# Altium footprint library agus_lib.PcbLib: 45 footprints (part 1 of 3)
Each footprint in its own frame and in the unit in brackets; x right, y up, seen from the top. Pads: shape width x height; smd on the part's side, far side on the other; paste and mask are expansions set on the pad; w line width, h text height; cw(c..) or ccw(c..) is an arc to the next point about the centre after c.
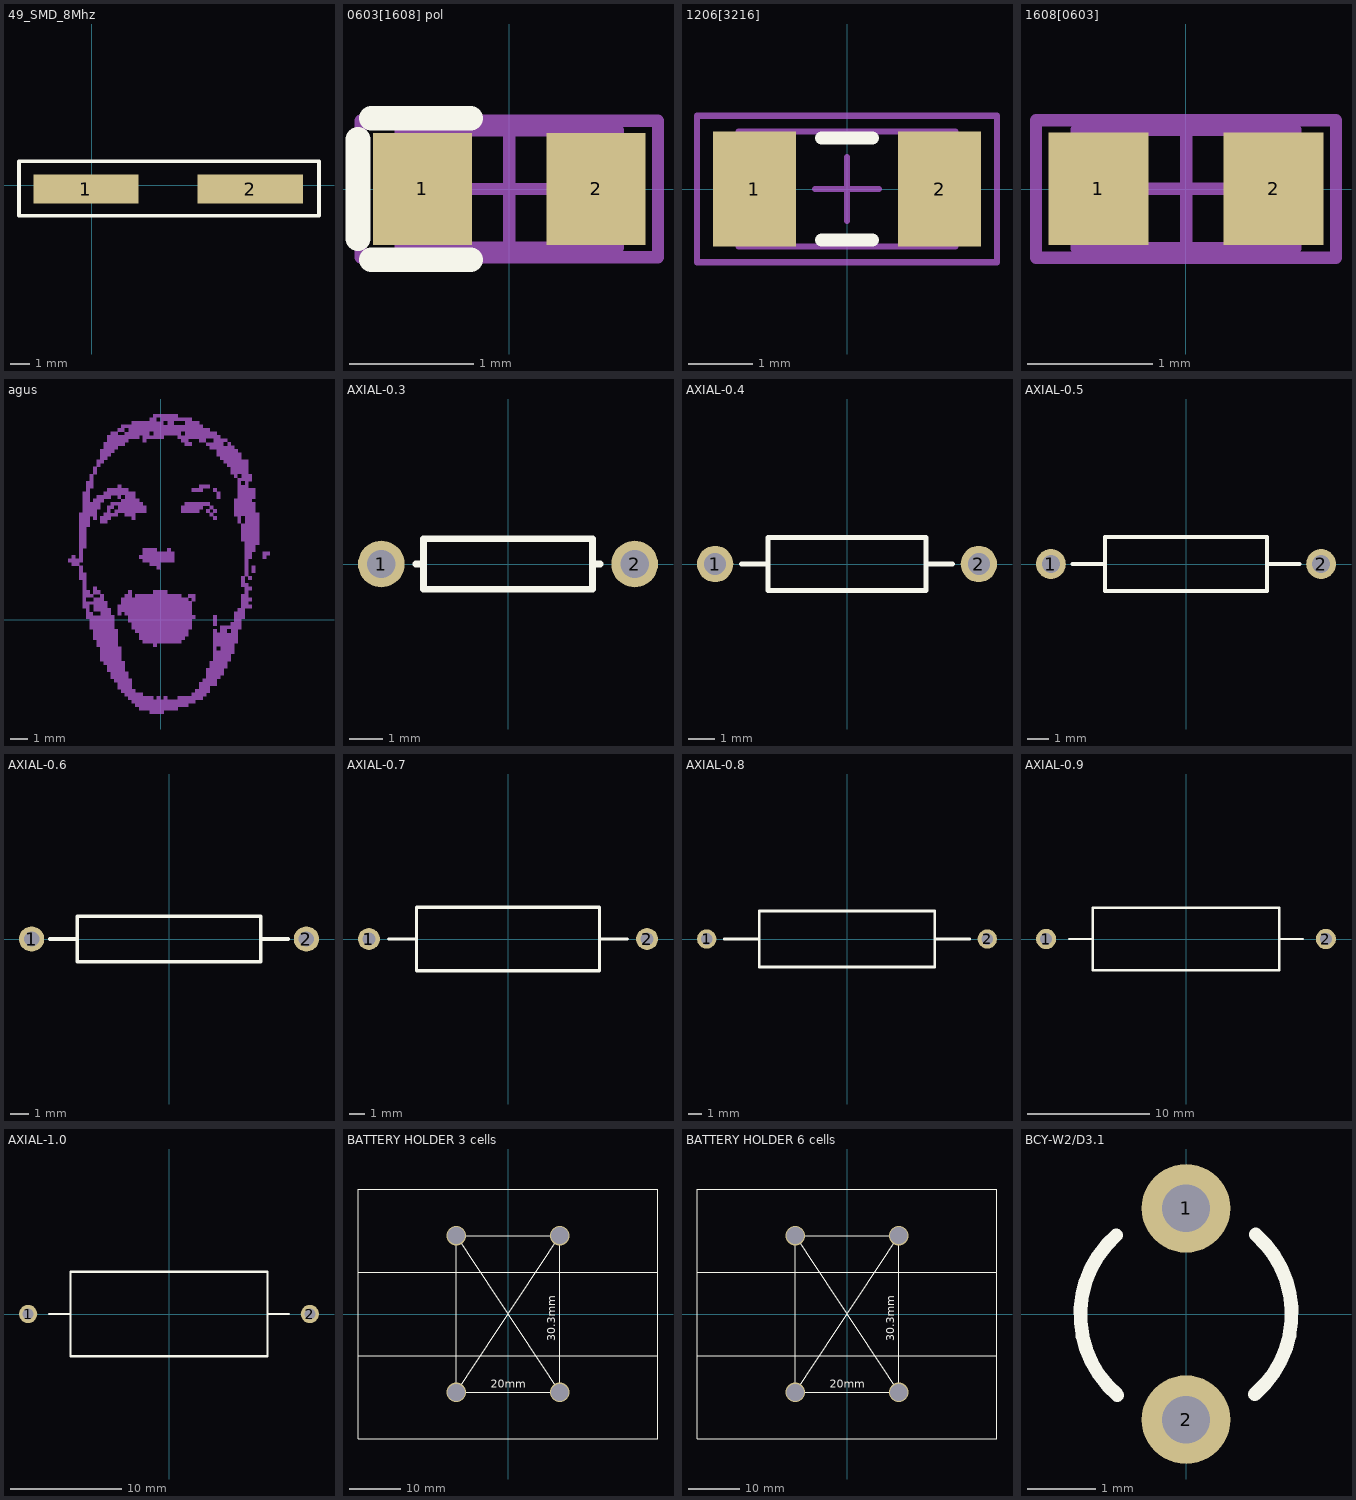
[diagram p0: the footprints below, top view; thin cyan lines are the x and y axes]

## 49_SMD_8Mhz [mm]
pads (2):
  rect 5.5x1.5 smd: 1(-0.3,-0.2) 2(8.3,-0.2)
Top Overlay:
  lines w0.2: 0.875,1.25 11.9,1.25 11.9,-1.6 -3.8,-1.6 -3.8,1.25 2.125,1.25
3D body: height 4.2, standoff 0, extent -2.33,-2.58 10.37,2.12

## 0603[1608] pol [mm] "Chip Capacitor, Body 1.6x0.8mm, IPC High Density"
height 1.3
pads (2):
  rect 0.8x0.9 smd: 1(-0.7,0) 2(0.7,0)
Top Overlay:
  lines w0.2: -1.22,-0.4 -1.22,0.4 ; -1.11,-0.57 -0.31,-0.57 ; -1.11,0.57 -0.31,0.57
Mechanical 13:
  lines w0.1: -0.875,-0.475 0.875,-0.475 0.875,0.475 -0.875,0.475 -0.875,-0.475
Mechanical 15:
  lines w0.1: -0.475,0 0.475,0 ; 0,-0.475 0,0.475 ; -1.2,-0.55 1.2,-0.55 1.2,0.55 -1.2,0.55 -1.2,-0.55
3D body: height 0.3, standoff 0, extent -0.8,-0.4 0.8,0.4

## 1206[3216] [mm] "Chip Capacitor, Body 3.2x1.6mm, IPC Medium Density"
height 1.35
pads (2):
  rect 1.3x1.8 smd: 1(-1.45,0) 2(1.45,0)
Top Overlay:
  lines w0.2: -0.4,-0.8 0.4,-0.8 ; -0.4,0.8 0.4,0.8
Mechanical 13:
  lines w0.1: -1.7,-0.9 1.7,-0.9 1.7,0.9 -1.7,0.9 -1.7,-0.9
Mechanical 15:
  lines w0.1: -0.5,0 0.5,0 ; 0,-0.5 0,0.5 ; -2.35,-1.15 2.35,-1.15 2.35,1.15 -2.35,1.15 -2.35,-1.15
3D body: height 1.35, standoff 0, extent -1.7,-0.9 1.7,0.9

## 1608[0603] [mm] "Chip Capacitor, Body 1.6x0.8mm, IPC High Density"
height 1.3
pads (2):
  rect 0.8x0.9 smd: 1(-0.7,0) 2(0.7,0)
Mechanical 13:
  lines w0.1: -0.875,-0.475 0.875,-0.475 0.875,0.475 -0.875,0.475 -0.875,-0.475
Mechanical 15:
  lines w0.1: -0.475,0 0.475,0 ; 0,-0.475 0,0.475 ; -1.2,-0.55 1.2,-0.55 1.2,0.55 -1.2,0.55 -1.2,-0.55
3D body: height 0.3, standoff 0, extent -0.8,-0.4 0.8,0.4

## agus [mm]
Bottom Overlay:
  drawing of 13 lines, arcs and shapes, not listed

## AXIAL-0.3 [mm] "Axial Device, Thru-Hole; 2 Leads; 0.3 in Pin Spacing"
height 1.524
pads (2):
  round 1.4 hole 0.85: 1(-3.81,0) 2(3.81,0)
Top Overlay:
  lines w0.2: -2.769,0 -2.54,0 ; 2.769,0 2.54,0 ; 2.54,0 2.54,0.762 -2.54,0.762 -2.54,-0.762 2.54,-0.762 2.54,0

## AXIAL-0.4 [mm] "Axial Device, Thru-Hole; 2 Leads; 0.4 in Pin Spacing"
height 2.032
pads (2):
  round 1.4 hole 0.85: 1(-5.08,0) 2(5.08,0)
Top Overlay:
  lines w0.2: -4.064,0 -3.048,0 ; 3.048,0 4.064,0 ; -3.048,-1.016 3.048,-1.016 3.048,1.016 -3.048,1.016 -3.048,-1.016
3D body: height 2.54, standoff -3.05, extent -5.062,-1.28 5.022,1.26

## AXIAL-0.5 [mm] "Axial Device, Thru-Hole; 2 Leads; 0.5 in Pin Spacing"
height 2.54
pads (2):
  round 1.4 hole 0.85: 1(-6.35,0) 2(6.35,0)
Top Overlay:
  lines w0.2: -5.334,0 -3.81,0 ; 3.81,0 5.334,0 ; -3.81,-1.27 -3.81,1.27 3.81,1.27 3.81,-1.27 -3.81,-1.27

## AXIAL-0.6 [mm] "Axial Device, Thru-Hole; 2 Leads; 0.6 in Pin Spacing"
height 2.54
pads (2):
  round 1.4 hole 0.85: 1(-7.62,0) 2(7.62,0)
Top Overlay:
  lines w0.2: -6.604,0 -5.08,0 ; 5.08,0 6.604,0 ; -5.08,-1.27 -5.08,1.27 5.08,1.27 5.08,-1.27 -5.08,-1.27

## AXIAL-0.7 [mm] "Axial Device, Thru-Hole; 2 Leads; 0.7 in Pin Spacing"
height 4.064
pads (2):
  round 1.4 hole 0.85: 1(-8.89,0) 2(8.89,0)
Top Overlay:
  lines w0.2: -7.62,0 -5.842,0 ; 5.842,0 7.62,0 ; -5.842,-2.032 -5.842,2.032 5.842,2.032 5.842,-2.032 -5.842,-2.032
3D body: height 6.5, standoff -4, extent -9.26,-3.02 9.32,2.972

## AXIAL-0.8 [mm] "Axial Device, Thru-Hole; 2 Leads; 0.8 in Pin Spacing"
height 4.064
pads (2):
  round 1.4 hole 0.85: 1(-10.16,0) 2(10.16,0)
Top Overlay:
  lines w0.2: -8.89,0 -6.35,0 ; 6.35,0 8.89,0 ; -6.35,-2.032 6.35,-2.032 6.35,2.032 -6.35,2.032 -6.35,-2.032

## AXIAL-0.9 [mm] "Axial Device, Thru-Hole; 2 Leads; 0.9 in Pin Spacing"
height 5.08
pads (2):
  round 1.65 hole 1: 1(-11.43,0) 2(11.43,0)
Top Overlay:
  lines w0.2: -9.525,0 -7.62,0 ; 7.62,0 9.525,0 ; -7.62,-2.54 -7.62,2.54 7.62,2.54 7.62,-2.54 -7.62,-2.54

## AXIAL-1.0 [mm] "Axial Device, Thru-Hole; 2 Leads; 1.0 in Pin Spacing"
height 7.62
pads (2):
  round 1.65 hole 1: 1(-12.7,0) 2(12.7,0)
Top Overlay:
  lines w0.2: -10.795,0 -8.89,0 ; 8.89,0 10.795,0 ; -8.89,-3.81 8.89,-3.81 8.89,3.81 -8.89,3.81 -8.89,-3.81

## BATTERY HOLDER 3 cells [mm]
via 10,-15.15 diameter 3.8 hole 3.3
via -10,-15.15 diameter 3.8 hole 3.3
via 10,15.15 diameter 3.8 hole 3.3
via -10,15.15 diameter 3.8 hole 3.3
Top Overlay:
  lines w0.2: -29,-8.05 29,-8.05 ; -29,8.05 29,8.05 ; -10,-15.15 10,15.15 ; -10,-15.15 -10,15.15 ; -10,-15.15 10,-15.15 ; -10,15.15 10,-15.15 ; -10,15.15 10,15.15 ; 10,-15.15 10,15.15 ; -29,-24.15 29,-24.15 29,24.15 -29,24.15 -29,-24.15
  text "30.3mm" at 9.13,-5.26 h1.52
  text "20mm" at -3.29,-14.28 h1.52
3D body: height 6, standoff -17, extent -12.5,12.263 -7.5,18.037
3D body: height 6, standoff -17, extent 7.5,12.263 12.5,18.037
3D body: height 6, standoff -17, extent -12.5,-18.037 -7.5,-12.263
3D body: height 6, standoff -17, extent 7.5,-18.037 12.5,-12.263
3D body: height 24.98, standoff 11.01, extent -25.605,-7.155 24.433,6.815
3D body: height 24.98, standoff 11.01, extent -25.693,8.605 24.345,22.575
3D body: height 26.51, standoff 10, extent -28.81,-24.676 28.848,24.6
3D body: height 24.98, standoff 11.01, extent -25.853,-23.145 24.185,-9.175
3D body: height 3.15, standoff 0.8, extent 7,-17.748 13,-12.552
3D body: height 3.15, standoff 0.8, extent -13,-17.748 -7,-12.552
3D body: height 3.15, standoff 0.8, extent -13,12.552 -7,17.748
3D body: height 3.15, standoff 0.8, extent 7,12.552 13,17.748

## BATTERY HOLDER 6 cells [mm]
via -10,15.15 diameter 3.8 hole 3.3
via 10,15.15 diameter 3.8 hole 3.3
via -10,-15.15 diameter 3.8 hole 3.3
via 10,-15.15 diameter 3.8 hole 3.3
Top Overlay:
  lines w0.2: -29,-8.05 29,-8.05 ; -29,8.05 29,8.05 ; -10,-15.15 10,-15.15 ; -10,-15.15 -10,15.15 ; -10,-15.15 10,15.15 ; -10,15.15 10,15.15 ; -10,15.15 10,-15.15 ; 10,-15.15 10,15.15 ; -29,-24.15 -29,24.15 29,24.15 29,-24.15 -29,-24.15
  text "20mm" at -3.29,-14.28 h1.52
  text "30.3mm" at 9.13,-5.26 h1.52
3D body: height 44, standoff 27.49, extent -28.81,-24.676 28.848,24.6
3D body: height 42.98, standoff 29.01, extent -25.853,-23.145 24.185,-9.175
3D body: height 42.98, standoff 29.01, extent -25.605,-7.155 24.433,6.815
3D body: height 42.98, standoff 29.01, extent -25.693,8.605 24.345,22.575
3D body: height 3.15, standoff 0.8, extent 7,12.552 13,17.748
3D body: height 3.15, standoff 0.8, extent -13,12.552 -7,17.748
3D body: height 3.15, standoff 0.8, extent -13,-17.748 -7,-12.552
3D body: height 3.15, standoff 0.8, extent 7,-17.748 13,-12.552
3D body: height 24.98, standoff 11.01, extent -25.853,-23.145 24.185,-9.175
3D body: height 26.51, standoff 10, extent -28.81,-24.676 28.848,24.6
3D body: height 24.98, standoff 11.01, extent -25.693,8.605 24.345,22.575
3D body: height 24.98, standoff 11.01, extent -25.605,-7.155 24.433,6.815
3D body: height 6, standoff -17, extent 7.5,-18.037 12.5,-12.263
3D body: height 6, standoff -17, extent -12.5,-18.037 -7.5,-12.263
3D body: height 6, standoff -17, extent 7.5,12.263 12.5,18.037
3D body: height 6, standoff -17, extent -12.5,12.263 -7.5,18.037

## BCY-W2/D3.1 [mm] "Crystal, Thru-Hole; 2 Leads; Body 3.1 x 8.2 mm (Dia.xH)"
height 8.2
pads (2):
  round 1.3 hole 0.7: 1(0,1.55) 2(0,-1.55)
Top Overlay:
  lines w0.2: -1.022,1.155 ccw(c0,-0.01) -1.006,-1.189 ; 1.006,-1.179 ccw(c0,0) 1.022,1.165
3D body: height 8.2, standoff -3, extent -1.01,-1.37 1.09,1.43